# Altium footprint library SMD Passive.PcbLib: 136 footprints (part 9 of 9)
Each footprint in its own frame and in the unit in brackets; x right, y up, seen from the top. Pads: shape width x height; smd on the part's side, far side on the other; paste and mask are expansions set on the pad; w line width, h text height; cw(c..) or ccw(c..) is an arc to the next point about the centre after c.
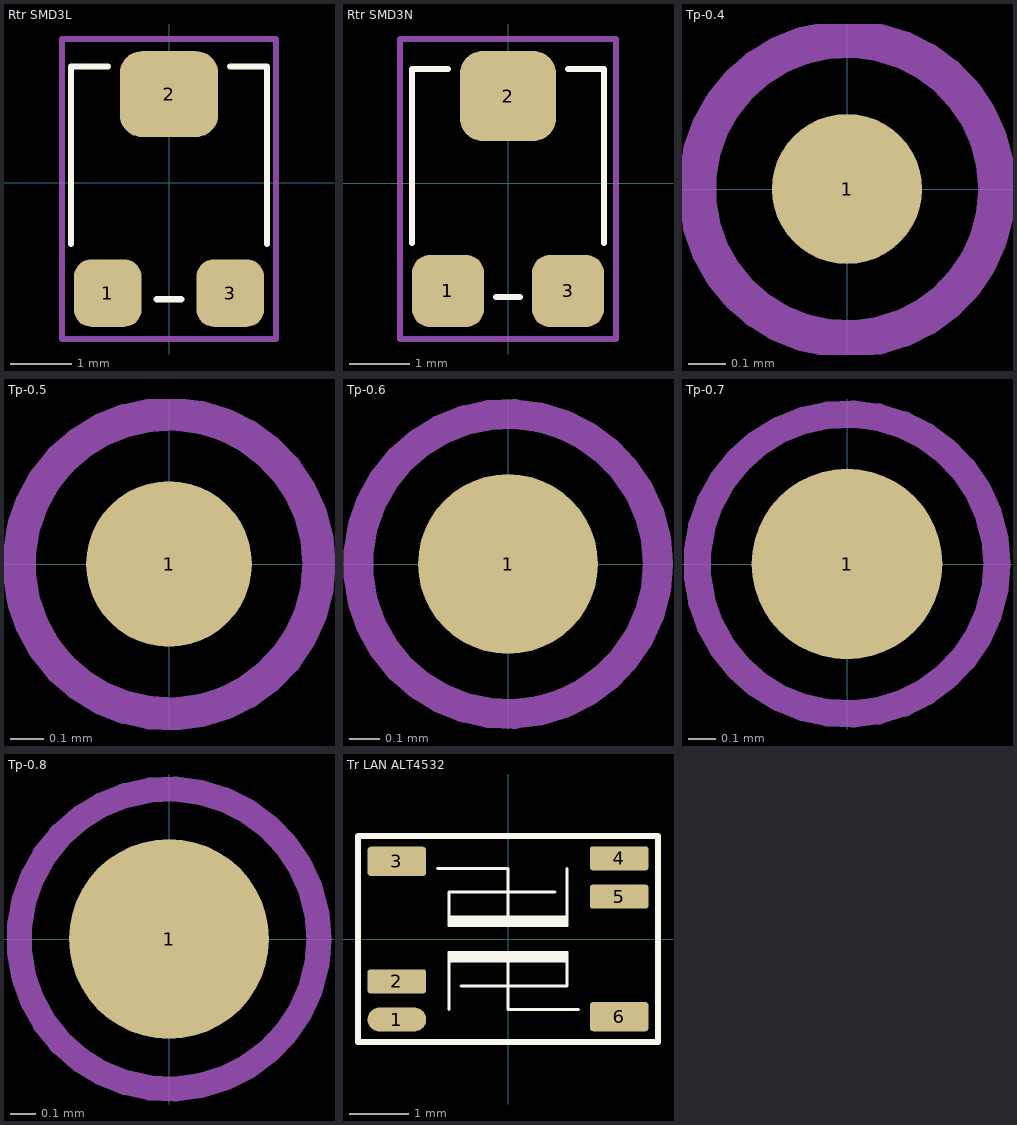
[diagram p8: the footprints below, top view; thin cyan lines are the x and y axes]

## Rtr SMD3L [mm]
pads (3):
  rrect50% 1.1x1.1 smd: 1(-1,-1.8) 3(1,-1.8)
  rrect50% 1.6x1.4 smd: 2(0,1.45)
Top Overlay:
  lines w0.1: -1.6,-1 -1.6,1.9 -1,1.9 ; -0.2,-1.9 0.2,-1.9 ; 1,1.9 1.6,1.9 1.6,-1
Top Courtyard:
  lines w0.1: -1.75,-2.55 -1.75,2.35 1.75,2.35 1.75,-2.55 -1.75,-2.55
3D body "R tr PVZ3A.STEP": height 1.95, standoff 0, extent -1.55,-1.85 1.55,1.84

## Rtr SMD3N [mm]
pads (3):
  rrect50% 1.2x1.2 smd: 1(-1,-1.8) 3(1,-1.8)
  rrect50% 1.6x1.5 smd: 2(0,1.45)
Top Overlay:
  lines w0.1: -1.6,-1 -1.6,1.9 -1,1.9 ; -0.2,-1.9 0.2,-1.9 ; 1,1.9 1.6,1.9 1.6,-1
Top Courtyard:
  lines w0.1: -1.8,-2.6 -1.8,2.4 1.8,2.4 1.8,-2.6 -1.8,-2.6
3D body "R tr PVZ3A.STEP": height 1.95, standoff 0, extent -1.55,-1.85 1.55,1.84

## Tp-0.4 [mm]
pads (1):
  round 0.4 smd paste-0.2: 1(0,0)
Top Courtyard:
  circle w0.1: c0,0 r0.4

## Tp-0.5 [mm]
pads (1):
  round 0.5 smd paste-0.2: 1(0,0)
Top Courtyard:
  circle w0.1: c0,0 r0.453

## Tp-0.6 [mm]
pads (1):
  round 0.6 smd paste-0.2: 1(0,0)
Top Courtyard:
  circle w0.1: c0,0 r0.5

## Tp-0.7 [mm]
pads (1):
  round 0.7 smd paste-0.2: 1(0,0)
Top Courtyard:
  circle w0.1: c0,0 r0.55

## Tp-0.8 [mm]
pads (1):
  round 0.8 smd paste-0.2: 1(0,0)
Top Courtyard:
  circle w0.1: c0,0 r0.6

## Tr LAN ALT4532 [mm]
pads (6):
  oval 1x0.41 smd: 1(-1.89,-1.37)
  rrect25% 1x0.41 smd: 2(-1.89,-0.72) 4(1.89,1.37) 5(1.89,0.72)
  rrect25% 1x0.5 smd: 3(-1.89,1.32) 6(1.89,-1.32)
Top Overlay:
  rectangle: -1,0.2 1,0.4
  rectangle: -1,-0.4 1,-0.2
  lines w0.05: -1.2,1.2 0,1.2 0,0.4 ; -1,-1.2 -1,-0.225 ; -1,0.225 -1,0.8 0.8,0.8 ; -0.8,-0.8 1,-0.8 1,-0.225 ; 0,-0.4 0,-1.2 1.2,-1.2 ; 1,0.225 1,1.2
  lines w0.1: -2.55,-1.75 2.55,-1.75 2.55,1.75 -2.55,1.75 -2.55,-1.75
Top Courtyard:
  lines w0.1: -2.55,-1.75 -2.55,1.75 2.55,1.75 2.55,-1.75 -2.55,-1.75
3D body "Lan Transformer ALT4532M.STEP": height 2.2, standoff 0, extent -2.25,-1.6 2.25,1.6